# Altium footprint library 我的元件库01.PcbLib: 321 footprints (part 16 of 21)
Each footprint in its own frame and in the unit in brackets; x right, y up, seen from the top. Pads: shape width x height; smd on the part's side, far side on the other; paste and mask are expansions set on the pad; w line width, h text height; cw(c..) or ccw(c..) is an arc to the next point about the centre after c.
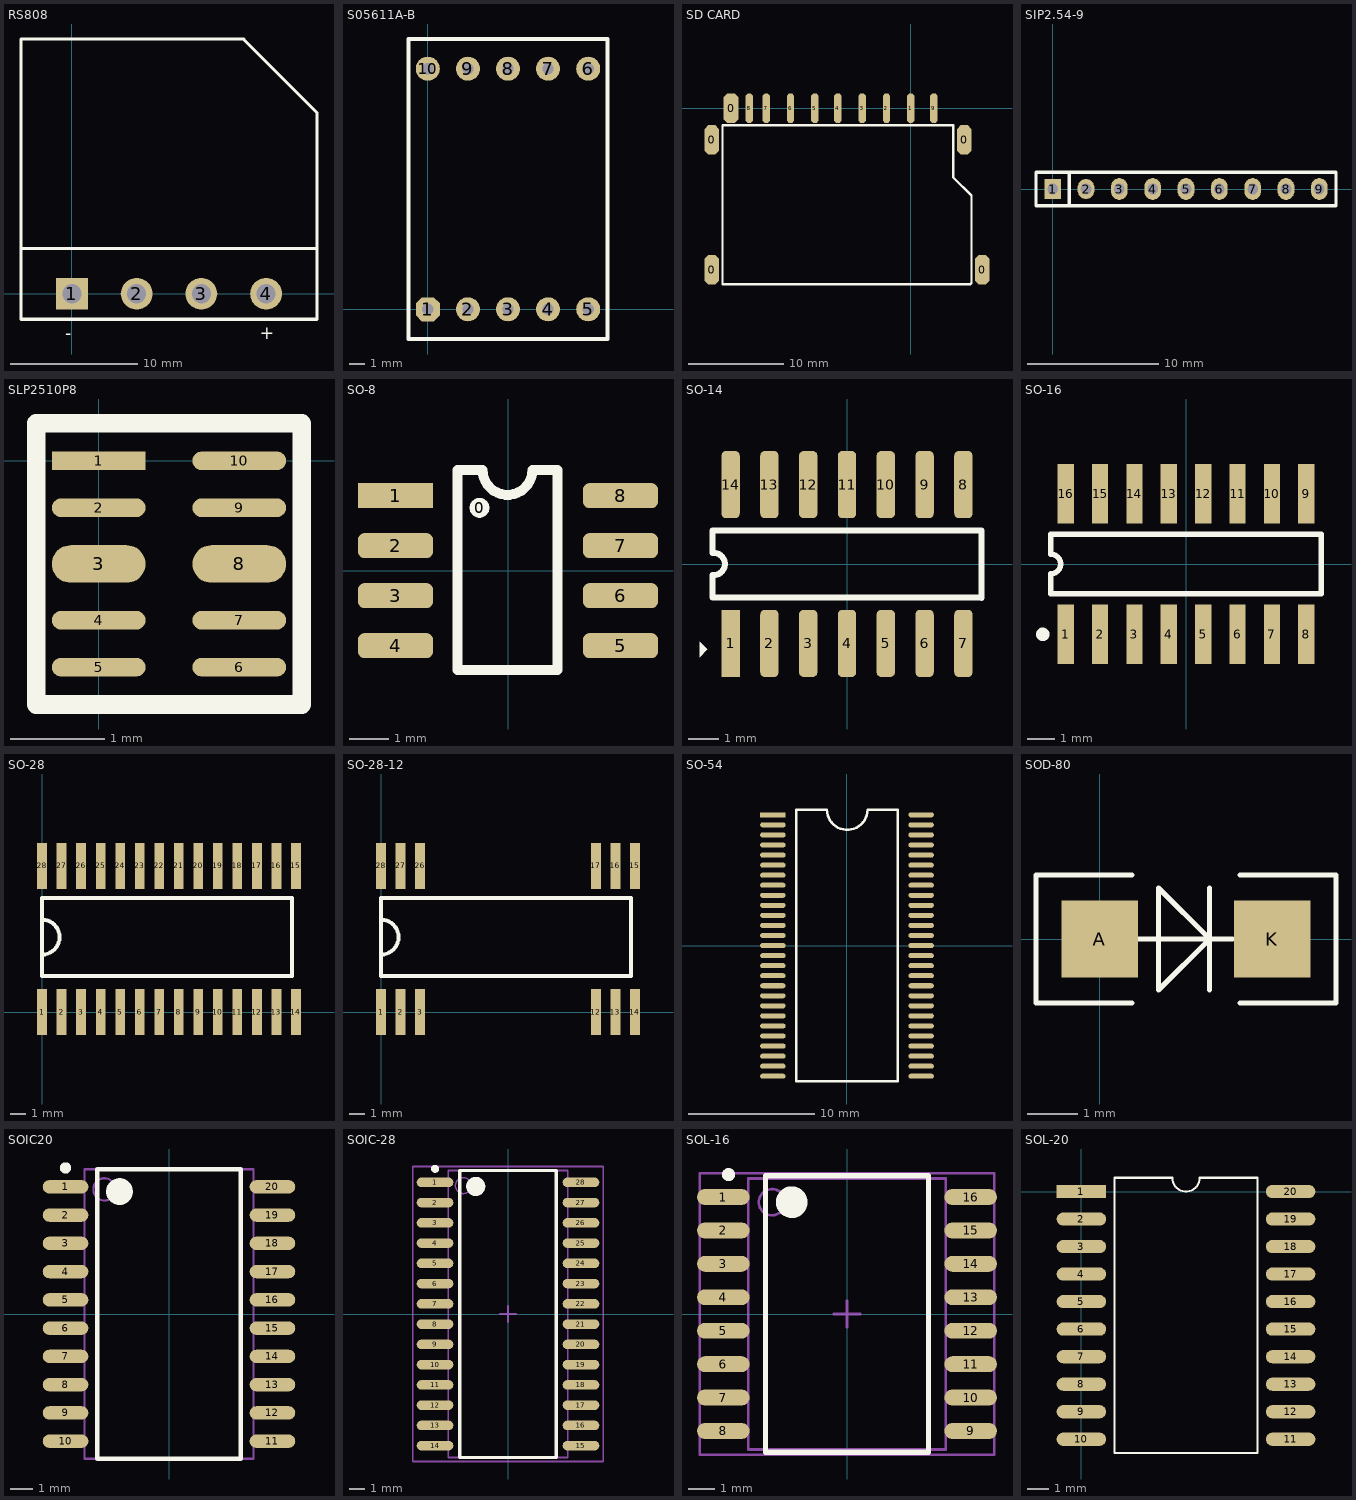
[diagram p15: the footprints below, top view; thin cyan lines are the x and y axes]

## RS808 [mm]
pads (4):
  rect 2.5x2.5 hole 1.5: 1(0,0)
  round 2.5 hole 1.5: 2(5.08,0) 3(10.16,0) 4(15.24,0)
Top Overlay:
  lines w0.127: 13.208,20 13.464,20 13.208,20
  lines w0.254: -4,3.556 19.1,3.556 ; 13.464,20 19.24,14.224 ; 13.5,20 -4,20 -4,-2 19.24,-2 19.24,14.2
  text "+" at 14.732,-3.556 h1.02
  text "-" at -0.508,-3.556 h1.02

## S05611A-B [mil]
pads (10):
  oct 60x60 hole 28: 1(0,0)
  round 60 hole 28: 2(100,0) 3(200,0) 4(300,0) 5(400,0) 6(400,600) 7(300,600) 8(200,600) 9(100,600) 10(0,600)
Top Overlay:
  lines w10: -48.03,-74.02 -48.03,674.02 448.03,674.02 448.03,-74.02 -48.03,-74.02
  text ".56'" at 100,280 h60
3D body "S5611A-B.STEP": height 316.25, standoff -156.19, extent -50,-75 450,675

## SD CARD [mil]
pads (14):
  oct 60x120 smd: 0(-820,-665) 0(-820,-130) 0(-740,0) 0(220,-130) 0(295,-665)
  oct 30x120 smd: 1(0,0) 2(-100,0) 3(-200,0) 4(-300,0) 5(-395,0) 6(-495,0) 7(-595,0) 8(-665,0) 9(95,0)
Top Overlay:
  lines w10: -775,-725 245,-725 250,-720 250,-360 175,-285 175,-70 -775,-70 -775,-725
3D body "SW3dPS-SD SOKET HAFIZALI.STEP": height 118.57, standoff -38.91, extent -848.99,-1369.64 276.99,28

## SIP2.54-9 [mil]
pads (9):
  rect 50x60 hole 32: 1(0,0)
  oval 50x60 hole 32: 2(100,0)
  oval 50x65 hole 32: 3(200,0) 4(300,0) 5(400,0) 6(500,0) 7(600,0) 8(700,0) 9(800,0)
Top Overlay:
  lines w10: 50,-50 50,50 ; -50,-50 -50,50 850,50 850,-50 -50,-50

## SLP2510P8 [mm]
pads (10):
  rect 1x0.2 smd: 1(0,0)
  oval 1x0.2 smd: 2(0,-0.5) 4(0,-1.7) 5(0,-2.2) 6(1.5,-2.2) 7(1.5,-1.7) 9(1.5,-0.5) 10(1.5,0)
  oval 1x0.4 smd: 3(0,-1.1) 8(1.5,-1.1)
Top Overlay:
  lines w0.2: -0.665,-2.6 2.165,-2.6 2.165,0.4 -0.665,0.4 -0.665,-2.6

## SO-8 [mil]
pads (9):
  round 20 on Top Overlay: 0(-28.5,62.8)
  rect 75x25 smd: 1(-112.5,75)
  rrect50% 75x25 smd: 2(-112.5,25) 3(-112.5,-25) 4(-112.5,-75) 5(112.5,-75) 6(112.5,-25) 7(112.5,25) 8(112.5,75)
Top Overlay:
  lines w10: -28.5,100.8 -50.5,100.8 -50.5,-99.2 49.5,-99.2 49.5,100.8 24.5,100.8 cw(c-0.5,100.8) -25.5,100.8
3D body "SO-8.STEP": height -15, standoff -81.93, extent -118.1,-96.46 118.12,96.46

## SO-14 [mm]
height 3
pads (14):
  rect 0.6x2.2 smd: 1(-3.81,-2.6)
  rrect50% 0.6x2.2 smd: 2(-2.54,-2.6) 3(-1.27,-2.6) 4(0,-2.6) 5(1.27,-2.6) 6(2.54,-2.6) 7(3.81,-2.6) 8(3.81,2.6) 9(2.54,2.6) 10(1.27,2.6) 11(0,2.6) 12(-1.27,2.6) 13(-2.54,2.6) 14(-3.81,2.6)
Top Overlay:
  region: -4.826,-2.54 -4.572,-2.794 -4.826,-3.048
  lines w0.2: -4.4,-0.367 -4.4,-1.1 4.4,-1.1 ; -4.4,0.367 -4.4,1.1 4.4,1.1 ; -4.365,-0.367 ccw(c-4.365,0) -4.365,0.367 ; 4.4,-1.108 4.4,1.092
3D body "SOP14.step": height 1.61, standoff 0, extent -4.35,-3.023 4.35,3.177

## SO-16 [mm]
pads (16):
  rect 0.6x2.2 smd: 1(-4.445,-2.6) 2(-3.175,-2.6) 3(-1.905,-2.6) 4(-0.635,-2.6) 5(0.635,-2.6) 6(1.905,-2.6) 7(3.175,-2.6) 8(4.445,-2.6) 9(4.445,2.6) 10(3.175,2.6) 11(1.905,2.6) 12(0.635,2.6) 13(-0.635,2.6) 14(-1.905,2.6) 15(-3.175,2.6) 16(-4.445,2.6)
Top Overlay:
  circle w0.25: c-5.295,-2.6 r0.125
  lines w0.2: -5,-1.1 5,-1.1 5,1.1 -5,1.1 -5,0.367 cw(c-5,0) -5,-0.367 -5,-1.1
3D body "SOP16_Y.stp": height 1.68, standoff 0, extent -5.004,-3.78 4.996,3.831

## SO-28 [mm]
pads (28):
  rect 0.635x3 smd: 1(0,0) 2(1.27,0) 3(2.54,0) 4(3.81,0) 5(5.08,0) 6(6.35,0) 7(7.62,0) 8(8.89,0) 9(10.16,0) 10(11.43,0) 11(12.7,0) 12(13.97,0) 13(15.24,0) 14(16.51,0) 15(16.51,9.5) 16(15.24,9.5) 17(13.97,9.5) 18(12.7,9.5) 19(11.43,9.5) 20(10.16,9.5) 21(8.89,9.5) 22(7.62,9.5) 23(6.35,9.5) 24(5.08,9.5) 25(3.81,9.5) 26(2.54,9.5) 27(1.27,9.5) 28(0,9.5)
Top Overlay:
  lines w0.254: 0,3.736 ccw(c0,4.872) 0,6.008 ; 0,2.332 16.256,2.332 16.256,7.412 0,7.412 0,2.332
3D body "SW3dPS-80072036 SO28.STEP": height 2.39, standoff -0.25, extent -0.813,-0.585 17.267,10.085

## SO-28-12 [mm]
pads (12):
  rect 0.635x3 smd: 1(0,0) 2(1.27,0) 3(2.54,0) 12(13.97,0) 13(15.24,0) 14(16.51,0) 15(16.51,9.5) 16(15.24,9.5) 17(13.97,9.5) 26(2.54,9.5) 27(1.27,9.5) 28(0,9.5)
Top Overlay:
  lines w0.254: 0,3.736 ccw(c0,4.872) 0,6.008 ; 0,2.332 16.256,2.332 16.256,7.412 0,7.412 0,2.332
3D body "SW3dPS-80072036 SO28.STEP": height 2.39, standoff -0.25, extent -0.813,-0.585 17.267,10.085

## SO-54 [mm]
pads (54):
  rect 2.032x0.4 smd: 1(-5.9,10.4)
  oval 2.032x0.4 smd: 2(-5.9,9.6) 3(-5.9,8.8) 4(-5.9,8) 5(-5.9,7.2) 6(-5.9,6.4) 7(-5.9,5.6) 8(-5.9,4.8) 9(-5.9,4) 10(-5.9,3.2) 11(-5.9,2.4) 12(-5.9,1.6) 13(-5.9,0.8) 14(-5.9,0) 15(-5.9,-0.8) 16(-5.9,-1.6) 17(-5.9,-2.4) 18(-5.9,-3.2) 19(-5.9,-4) 20(-5.9,-4.8) 21(-5.9,-5.6) 22(-5.9,-6.4) 23(-5.9,-7.2) 24(-5.9,-8) 25(-5.9,-8.8) 26(-5.9,-9.6) 27(-5.9,-10.4) 28(5.9,-10.4) 29(5.9,-9.6) 30(5.9,-8.8) 31(5.9,-8) 32(5.9,-7.2) 33(5.9,-6.4) 34(5.9,-5.6) 35(5.9,-4.8) 36(5.9,-4) 37(5.9,-3.2) 38(5.9,-2.4) 39(5.9,-1.6) 40(5.9,-0.8) 41(5.9,0) 42(5.9,0.8) 43(5.9,1.6) 44(5.9,2.4) 45(5.9,3.2) 46(5.9,4) 47(5.9,4.8) 48(5.9,5.6) 49(5.9,6.4) 50(5.9,7.2) 51(5.9,8) 52(5.9,8.8) 53(5.9,9.6) 54(5.9,10.4)
Top Overlay:
  lines w0.2: 1.642,10.8 4.049,10.8 4.049,-10.8 -4.049,-10.8 -4.049,10.8 -1.604,10.8 ccw(c0.019,10.834) 1.642,10.801

## SOD-80 [mil]
pads (2):
  rect 60x60 smd: A(0,0) K(135,0)
Top Overlay:
  lines w3.94: 25,-50 -50,-50 -50,50 25,50 ; 30,0 104,0 ; 86,-40 86,0 ; 86,40 86,0 ; 110,-50 185,-50 185,50 110,50 ; 86,0 46,-40 46,40 86,0
3D body "User Library-Diode MELF.STEP": height 59.53, standoff 0.47, extent 1.1,-29.06 138.9,30

## SOIC20 [mm] "SOIC, 20-Leads, Body 12.80x7.50mm, Pitch 1.27mm, IPC Medium Density"
height 2.65
pads (20):
  oval 2.05x0.6 smd: 1(-4.65,5.715) 2(-4.65,4.445) 3(-4.65,3.175) 4(-4.65,1.905) 5(-4.65,0.635) 6(-4.65,-0.635) 7(-4.65,-1.905) 8(-4.65,-3.175) 9(-4.65,-4.445) 10(-4.65,-5.715) 11(4.65,-5.715) 12(4.65,-4.445) 13(4.65,-3.175) 14(4.65,-1.905) 15(4.65,-0.635) 16(4.65,0.635) 17(4.65,1.905) 18(4.65,3.175) 19(4.65,4.445) 20(4.65,5.715)
Top Overlay:
  circle w0.6: c-2.225,5.5 r0.3
  circle w0.25: c-4.65,6.565 r0.125
  lines w0.2: -3.225,-6.5 3.225,-6.5 3.225,6.5 -3.225,6.5 -3.225,-6.5
Mechanical 13:
  circle w0.1: c-2.9,5.6 r0.5
  lines w0.1: -3.8,-6.5 3.8,-6.5 3.8,6.5 -3.8,6.5 -3.8,-6.5
3D body: height 2.65, standoff 0.1, extent -3.8,-6.5 3.8,6.5

## SOIC-28 [mm] "SOIC, 28-Leads, Body 18.0x7.5mm (max), Pitch 1.27mm, IPC Medium Density"
height 2.65
pads (28):
  oval 2.3x0.6 smd: 1(-4.575,8.255) 2(-4.575,6.985) 3(-4.575,5.715) 4(-4.575,4.445) 5(-4.575,3.175) 6(-4.575,1.905) 7(-4.575,0.635) 8(-4.575,-0.635) 9(-4.575,-1.905) 10(-4.575,-3.175) 11(-4.575,-4.445) 12(-4.575,-5.715) 13(-4.575,-6.985) 14(-4.575,-8.255) 15(4.575,-8.255) 16(4.575,-6.985) 17(4.575,-5.715) 18(4.575,-4.445) 19(4.575,-3.175) 20(4.575,-1.905) 21(4.575,-0.635) 22(4.575,0.635) 23(4.575,1.905) 24(4.575,3.175) 25(4.575,4.445) 26(4.575,5.715) 27(4.575,6.985) 28(4.575,8.255)
Top Overlay:
  circle w0.6: c-2.025,8 r0.3
  circle w0.25: c-4.575,9.105 r0.125
  lines w0.2: -3.025,-9 3.025,-9 3.025,9 -3.025,9 -3.025,-9
Mechanical 13:
  circle w0.1: c-2.8,8.05 r0.5
  lines w0.1: -3.75,-9 3.75,-9 3.75,9 -3.75,9 -3.75,-9
Mechanical 15:
  lines w0.1: -0.5,0 0.5,0 ; 0,-0.5 0,0.5 ; -5.975,-9.25 5.975,-9.25 5.975,9.25 -5.975,9.25 -5.975,-9.25
3D body: height 2.65, standoff 0.3, extent -3.75,-9 3.75,9

## SOL-16 [mm] "16-Pin Small Outline Integrated Circuit 1.27 mm Pitch, IPC High Density"
height 2.65
pads (16):
  oval 2x0.6 smd: 1(-4.7,4.445) 2(-4.7,3.175) 3(-4.7,1.905) 4(-4.7,0.635) 5(-4.7,-0.635) 6(-4.7,-1.905) 7(-4.7,-3.175) 8(-4.7,-4.445) 9(4.7,-4.445) 10(4.7,-3.175) 11(4.7,-1.905) 12(4.7,-0.635) 13(4.7,0.635) 14(4.7,1.905) 15(4.7,3.175) 16(4.7,4.445)
Top Overlay:
  circle w0.6: c-2.1,4.25 r0.3
  circle w0.25: c-4.5,5.295 r0.125
  lines w0.2: -3.1,-5.25 3.1,-5.25 3.1,5.25 -3.1,5.25 -3.1,-5.25
Mechanical 13:
  circle w0.1: c-2.85,4.25 r0.5
  lines w0.1: -3.75,-5.15 3.75,-5.15 3.75,5.15 -3.75,5.15 -3.75,-5.15
Mechanical 15:
  lines w0.1: -0.5,0 0.5,0 ; 0,-0.5 0,0.5 ; -5.6,-5.35 5.6,-5.35 5.6,5.35 -5.6,5.35 -5.6,-5.35
3D body "User Library-SOIC16-300.STEP": height 2.65, standoff 0, extent -5.182,-5.144 5.118,5.156

## SOL-20 [mil]
pads (20):
  rect 90x24 smd: 1(0,0)
  oval 90x24 smd: 2(0,-50) 3(0,-100) 4(0,-150) 5(0,-200) 6(0,-250) 7(0,-300) 8(0,-350) 9(0,-400) 10(0,-450) 11(380,-450) 12(380,-400) 13(380,-350) 14(380,-300) 15(380,-250) 16(380,-200) 17(380,-150) 18(380,-100) 19(380,-50) 20(380,0)
Top Overlay:
  lines w4: 60,-475 320,-475 320,25 215,25 cw(c190,25) 165,25 60,25 60,-475